# Altium footprint library LDCN Components.PcbLib: 426 footprints (part 12 of 27)
Each footprint in its own frame and in the unit in brackets; x right, y up, seen from the top. Pads: shape width x height; smd on the part's side, far side on the other; paste and mask are expansions set on the pad; w line width, h text height; cw(c..) or ccw(c..) is an arc to the next point about the centre after c.
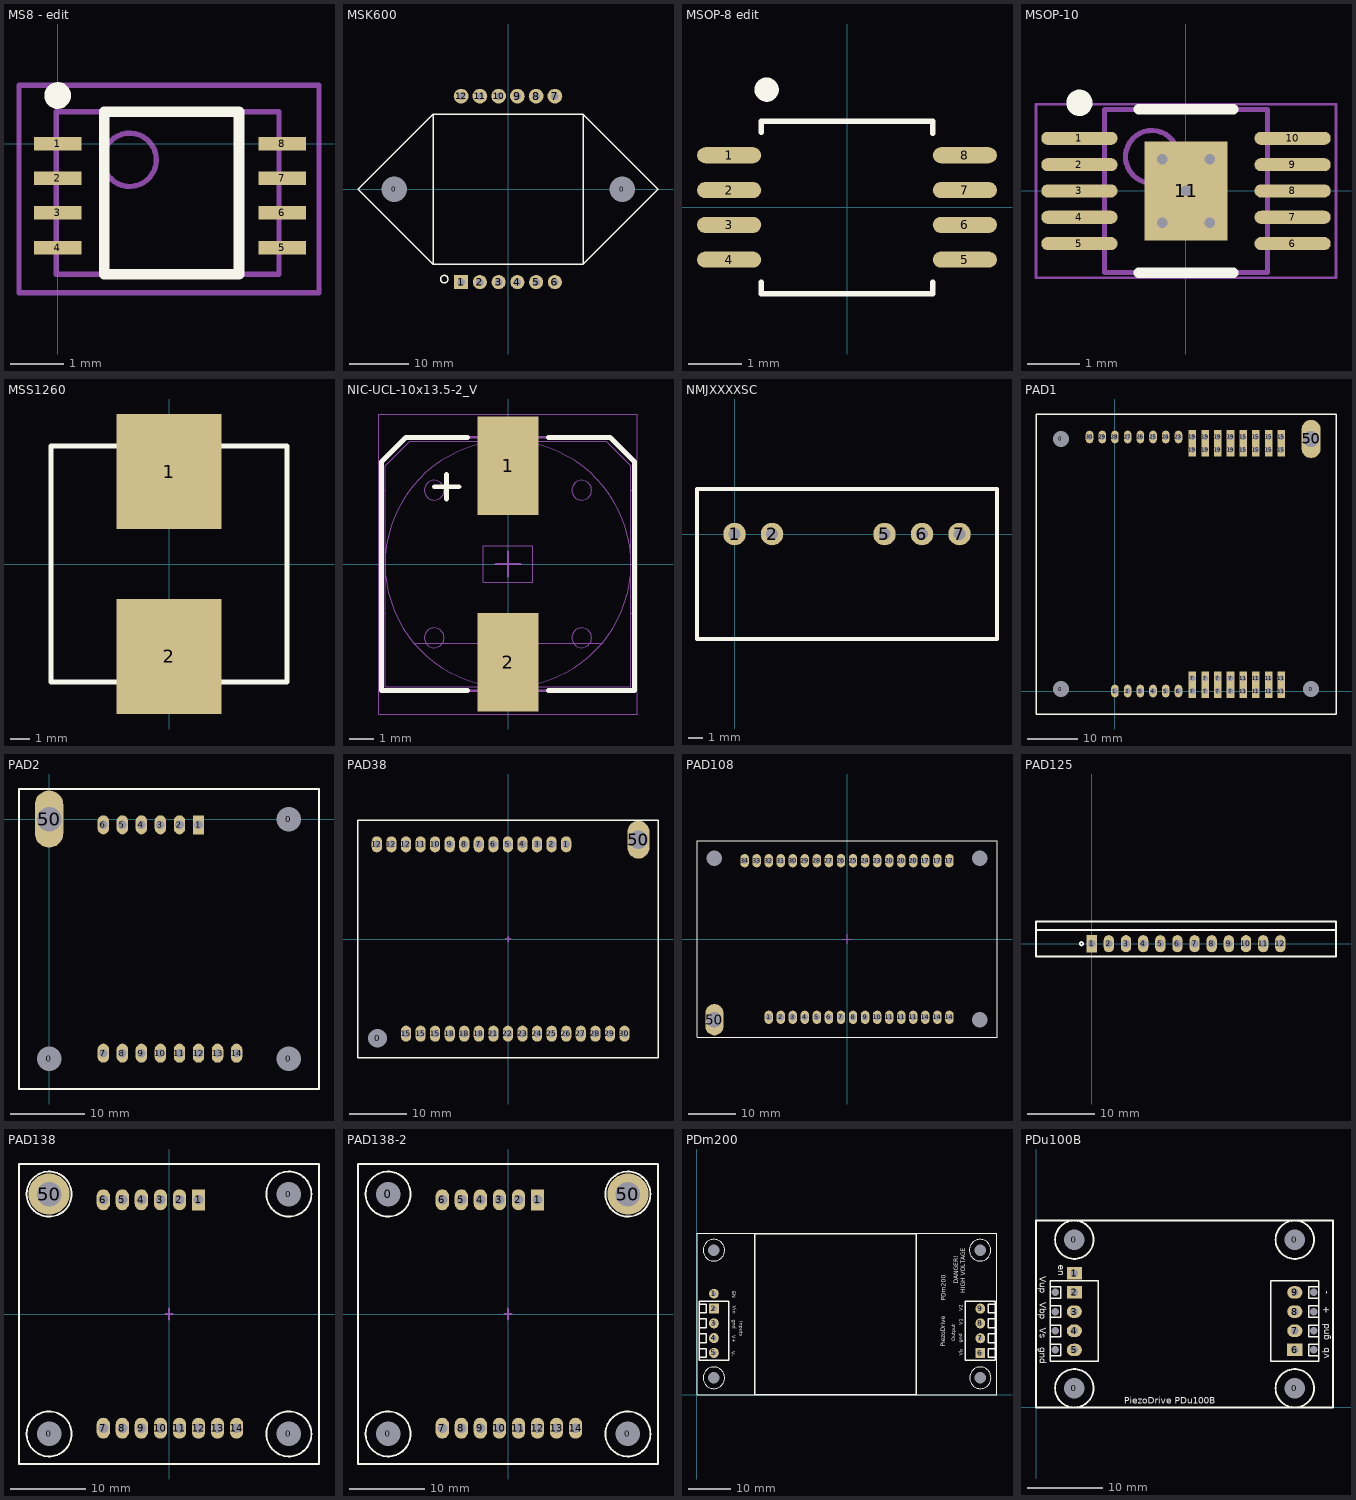
[diagram p11: the footprints below, top view; thin cyan lines are the x and y axes]

## MS8 - edit [mil] "SOIC, 8-Leads, MSOP, Body 3mmx3mm"
height 43.31
pads (8):
  rect 35x10 smd: 1(0,0) 2(0,-25.59) 3(0,-51.18) 4(0,-76.77) 5(165.79,-76.77) 6(165.79,-51.18) 7(165.79,-25.59) 8(165.79,0)
Top Overlay:
  circle w9.84: c0,35.43 r4.92
  lines w7.87: 34.45,-96.46 34.45,23.43 133.86,23.43 133.86,-96.46 34.45,-96.46
Mechanical 13:
  circle w3.94: c53.15,-12.01 r19.68
  lines w3.94: -0.98,-96.46 -0.98,23.43 163.39,23.43 163.39,-96.46 -0.98,-96.46
Mechanical 15:
  lines w3.94: -28.54,-110.24 192.91,-110.24 192.91,43.11 -28.54,43.11 -28.54,-110.24
3D body: height 68.9, standoff 0, extent -0.98,-96.46 163.39,23.43

## MSK600 [mm] "Footprint of MSK600"
height 40
pads (14):
  round 1.524 hole 4.318 unplated: 0(-19.304,0) 0(19.304,0)
  rect 2.4x2.4 hole 1.3: 1(-7.938,-15.748)
  round 2.4 hole 1.3: 2(-4.763,-15.748) 3(-1.587,-15.748) 4(1.587,-15.748) 5(4.763,-15.748) 6(7.938,-15.748)
  round 2.5 hole 1.3: 7(7.938,15.748) 8(4.763,15.748) 9(1.587,15.748) 10(-1.587,15.748) 11(-4.763,15.748) 12(-7.938,15.748)
Top Overlay:
  circle w0.254: c-10.795,-15.24 r0.635
  lines w0.254: -12.7,-12.7 -12.7,12.7 ; -12.7,-12.7 12.7,-12.7 ; -12.7,-12.7 -25.4,0 -12.7,12.7 ; -12.7,12.7 12.7,12.7 ; 12.7,-12.7 12.7,12.7 ; 12.7,-12.7 25.4,0 12.7,12.7

## MSOP-8 edit [mm] "8-Lead Plastic MSOP Package 3mmx3mm"
height 1.1
pads (8):
  oval 1.2x0.3 smd: 1(-2.2,0.975) 2(-2.2,0.325) 3(-2.2,-0.325) 4(-2.2,-0.975) 5(2.2,-0.975) 6(2.2,-0.325) 7(2.2,0.325) 8(2.2,0.975)
Top Overlay:
  circle w0.254: c-1.5,2.2 r0.1
  lines w0.1: -1.6,-1.39 -1.6,-1.61 1.6,-1.61 1.6,-1.39 ; -1.6,1.4 -1.6,1.61 1.6,1.61 1.6,1.38
3D body: height 1.1, standoff 0, extent -1.5,-1.5 1.5,1.5

## MSOP-10 [mm] "MSOP-10 with exposed pad"
height 2
pads (11):
  oval 1.45x0.25 smd: 1(-2.025,1) 2(-2.025,0.5) 3(-2.025,0) 4(-2.025,-0.5) 5(-2.025,-1) 6(2.025,-1) 7(2.025,-0.5) 8(2.025,0) 9(2.025,0.5) 10(2.025,1)
  rect 1.57x1.88 smd: 11(0,0)
via -0.45,0.6 diameter 0.5 hole 0.2
via -0.45,-0.6 diameter 0.5 hole 0.2
via 0.45,-0.6 diameter 0.5 hole 0.2
via 0.45,0.6 diameter 0.5 hole 0.2
via 0,0 diameter 0.5 hole 0.2
Top Overlay:
  circle w0.25: c-2.025,1.675 r0.125
  lines w0.2: -0.9,-1.55 0.9,-1.55 ; -0.9,1.55 0.9,1.55
Mechanical 13:
  circle w0.1: c-0.65,0.65 r0.5
  lines w0.1: -1.55,-1.55 1.55,-1.55 1.55,1.55 -1.55,1.55 -1.55,-1.55
Mechanical 15:
  lines w0.05: -2.85,-1.65 2.85,-1.65 2.85,1.65 -2.85,1.65 -2.85,-1.65
  lines w0.1: -0.5,0 0.5,0 ; 0,-0.5 0,0.5
3D body: height 1.1, standoff 0.05, extent -1.55,-1.55 1.55,1.55

## MSS1260 [mm] "Coilcraft MSS1260 Inductors"
height 6
pads (2):
  rect 5.5x6 smd: 1(0,4.826) 2(0,-4.826)
Top Overlay:
  lines w0.254: -6.15,-6.15 6.15,-6.15 6.15,6.15 -6.15,6.15 -6.15,-6.15

## NIC-UCL-10x13.5-2_V [mm] "SMD, 2-Leads,Body 10.3x10.3mm, Height 14.3mm"
height 14.3
pads (2):
  rect 2.5x4 smd: 1(0,4) 2(0,-4)
Top Overlay:
  lines w0.2: -3,3.143 -2,3.143 ; -2.5,2.643 -2.5,3.643 ; -1.65,-5.15 -5.15,-5.15 -5.15,4.15 -4.15,5.15 -1.65,5.15 ; 1.65,-5.15 5.15,-5.15 5.15,4.15 4.15,5.15 1.65,5.15
Mechanical 13:
  circle w0.01: c-3,3 r0.4
  circle w0.01: c3,3 r0.4
  circle w0.01: c-3,-3 r0.4
  circle w0.01: c3,-3 r0.4
  lines w0.01: -0.5,-5.45 0.5,-5.45 0.5,-2.65 ; -0.5,-5.45 -0.5,-2.651 ; 0.499,2.651 0.499,5.449 ; 0.5,5.45 -0.5,5.45 -0.5,2.65 ; -5.149,-5.149 5.149,-5.149 ; -5.15,-5.15 -5.15,-2 -5,-2 -5,-5 ; -5.15,-5.15 5.15,-5.15 ; -5,-5 5,-5 ; -5,-5 -5,4 ; -5,-5 5,-5 ; -5,4 -4,5 ; -5,4 -5,3 -5.15,3 -5.15,4.15 -4.15,5.15 4.15,5.15 5.15,4.15 5.15,3 5,3 5,4 ; -5,4 -4,5 ; -4,5 4,5 ; -4,5 4,5 ; -3.83,-3.214 ccw(c0,0) 3.83,-3.214 ; -3.83,-3.214 cw(c0,0) 3.83,-3.214 ; -3.83,-3.214 3.83,-3.214 ; -3.83,-3.214 3.83,-3.214 ; -3.83,-3.214 3.83,-3.214 ; -0.5,2.65 ccw(c0,2.65) 0.5,2.65 -0.5,2.65 ; 0.5,-2.65 ccw(c0,-2.65) -0.5,-2.65 0.5,-2.65 ; 4,5 5,4 ; 4,5 5,4 ; 5,-5 5,4 ; 5,-5 5,-2 5.15,-2 5.15,-5.149 5.149,-5.149 ; -1,-0.75 1,-0.75 1,0.75 -1,0.75 -1,-0.75
  lines w0.1: -5.15,-5.15 -5.15,4.15 -4.15,5.15 4.15,5.15 5.15,4.15 5.15,-5.15 -5.15,-5.15
Mechanical 15:
  lines w0.05: -5.25,-6.1 5.25,-6.1 5.25,6.1 -5.25,6.1 -5.25,-6.1
  lines w0.1: -0.5,0 0.5,0 ; 0,-0.5 0,0.5
3D body: height 0.5, standoff 0.3, extent -5,-5 5,5
3D body: height 0.8, standoff 0.3, extent -5.15,-5.001 5.15,5.15
3D body: height 0.8, standoff 0.3, extent -5.149,-5.149 5.149,3.999
3D body: height 14.3, standoff 0.5, extent -5.004,-3.214 5.001,5.012
3D body: height 14.3, standoff 0.5, extent -3.831,-5.001 3.831,-3.213
3D body: height 0.3, standoff 0, extent -0.499,2.651 0.499,5.449
3D body: height 0.3, standoff 0, extent -0.499,2.152 0.499,2.651
3D body: height 0.3, standoff 0, extent -1,-0.75 1,0.75
3D body: height 0.3, standoff 0, extent -0.5,-2.651 0.499,-2.152
3D body: height 0.3, standoff 0, extent -0.5,-5.45 0.499,-2.651
3D body: height 1.2, standoff 0.8, extent -5.151,2.999 5.151,5.151
3D body: height 0.3, standoff 0, extent 2.601,2.601 3.399,3.399
3D body: height 0.3, standoff 0, extent -3.399,2.601 -2.601,3.399
3D body: height 0.3, standoff 0, extent 2.601,-3.399 3.399,-2.601
3D body: height 0.3, standoff 0, extent -3.399,-3.399 -2.601,-2.601
3D body: height 1.5, standoff 0.8, extent -5.149,-5.149 5.149,-2.001

## NMJXXXXSC [mil]
height 393.7
pads (5):
  round 60 hole 32: 1(0,0) 2(100,0) 5(400,0) 6(500,0) 7(600,0)
Top Overlay:
  lines w10: -100,-280 700,-280 700,120 -100,120 -100,-280

## PAD1 [mil] "Footprint of PAD115"
height 196.85
pads (50):
  round 60 hole 129 unplated: 0(-425,15.5) 0(-425,1984.5) 0(1544,15.5)
  oval 60x100 hole 45: 1(0,0) 2(100,0) 3(200,0) 4(300,0) 5(400,0) 6(500,0) 23(500,2000) 24(400,2000) 25(300,2000) 26(200,2000) 27(100,2000) 28(0,2000) 29(-100,2000) 30(-200,2000)
  rect 60x110 hole 45: 7(610,0) 7(610,100) 7(710,0) 7(710,100) 7(810,0) 7(810,100) 7(910,0) 7(910,100) 11(1010,0) 11(1010,100) 11(1110,0) 11(1110,100) 11(1210,0) 11(1210,100) 11(1310,0) 11(1310,100) 15(1010,1900) 15(1010,2000) 15(1110,1900) 15(1110,2000) 15(1210,1900) 15(1210,2000) 15(1310,1900) 15(1310,2000) 19(610,1900) 19(610,2000) 19(710,1900) 19(710,2000) 19(810,1900) 19(810,2000) 19(910,1900) 19(910,2000)
  oval 150x300 hole 129: 50(1544,1984.5)
Top Overlay:
  lines w10: -621.5,-181 1740.5,-181 1740.5,2181 -621.5,2181 -621.5,-181

## PAD2 [mil] "Footprint of PAD183"
height 1574.8
pads (18):
  round 60 hole 129 unplated: 0(-0.16,-1260) 0(1259.84,-1260) 0(1259.84,0)
  rect 60x100 hole 45: 1(784.84,-30)
  oval 60x100 hole 45: 2(684.84,-30) 3(584.84,-30) 4(484.84,-30) 5(384.84,-30) 6(284.84,-30) 7(284.84,-1230) 8(384.84,-1230) 9(484.84,-1230) 10(584.84,-1230) 11(684.84,-1230) 12(784.84,-1230) 13(884.84,-1230) 14(984.84,-1230)
  oval 150x300 hole 129: 50(-0.16,0)
Top Overlay:
  lines w10: -158.16,-1418 1417.84,-1418 1417.84,158 -158.16,158 -158.16,-1418

## PAD38 [mil] "PAD38"
height 196.85
pads (32):
  round 78.74 hole 129: 0(-895.47,-681.5)
  oval 70x110 hole 52: 1(399.41,650) 2(299.41,650) 3(199.41,650) 4(99.41,650) 5(-0.59,650) 6(-100.59,650) 7(-200.59,650) 8(-300.59,650) 9(-400.59,650) 10(-500.59,650) 11(-600.59,650) 12(-900.59,650) 12(-800.59,650) 12(-700.59,650) 15(-700.2,-650) 15(-600.2,-650) 15(-500.2,-650) 18(-400.2,-650) 18(-300.2,-650) 18(-200.2,-650) 21(-100.2,-650) 22(-0.2,-650) 23(99.8,-650) 24(199.8,-650) 25(299.8,-650) 26(399.8,-650) 27(499.8,-650) 28(599.8,-650) 29(699.8,-650) 30(799.8,-650)
  oval 150x260 hole 129: 50(895.47,681.5)
Top Overlay:
  lines w10: -1029.92,-816.54 -1029.92,816.54 1029.92,816.54 1029.92,-816.54 -1029.92,-816.54
Mechanical 15:
  lines w10: -19.68,0 19.68,0 ; -0.2,-19.29 0,-19.09 0,19.68

## PAD108 [mil] "PAD108"
height 196.85
pads (38):
  round 60 hole 129 unplated: 0(-1100,670) 0(1100,-670) 0(1100,670)
  oval 70x110 hole 52: 1(-650,-650) 2(-550,-650) 3(-450,-650) 4(-350,-650) 5(-250,-650) 6(-150,-650) 7(-50,-650) 8(50,-650) 9(150,-650) 10(250,-650) 11(350,-650) 11(450,-650) 11(550,-650) 14(650,-650) 14(750,-650) 14(850,-650) 17(650,650) 17(750,650) 17(850,650) 20(350,650) 20(450,650) 20(550,650) 23(250,650) 24(150,650) 25(50,650) 26(-50,650) 27(-150,650) 28(-250,650) 29(-350,650) 30(-450,650) 31(-550,650) 32(-650,650) 33(-750,650) 34(-850,650)
  oval 150x260 hole 129: 50(-1100,-670)
Top Overlay:
  lines w10: -1245,-815 -1245,815 1245,815 1245,-815 -1245,-815
Mechanical 15:
  lines w10: -39.37,0 39.37,0 ; 0,-39.37 0,39.37

## PAD125 [mil] "Footprint of PAD125"
height 196.85
pads (12):
  rect 60x100 hole 45: 1(0,0)
  oval 60x100 hole 45: 2(100,0) 3(200,0) 4(300,0) 5(400,0) 6(500,0) 7(600,0) 8(700,0) 9(800,0) 10(900,0) 11(1000,0) 12(1100,0)
Top Overlay:
  circle w10: c-60,0 r10
  lines w10: -325,80 1425,80 ; -325,-75 1425,-75 1425,130 -325,130 -325,-75

## PAD138 [mil] "PAD138"
height 1574.8
pads (18):
  round 60 hole 129 unplated: 0(-630,-630) 0(630,-630) 0(630,630)
  rect 70x110 hole 52.01: 1(155,600)
  oval 70x110 hole 52.01: 2(55,600) 3(-45,600) 4(-145,600) 5(-245,600) 6(-345,600) 7(-345,-600) 8(-245,-600) 9(-145,-600) 10(-45,-600) 11(55,-600) 12(155,-600) 13(255,-600) 14(355,-600)
  round 216.54 hole 129: 50(-630,630)
Top Overlay:
  circle w10: c-630,630 r118.11
  circle w10: c-630,-630 r118.11
  circle w10: c630,-630 r118.11
  circle w10: c630,630 r118.11
  lines w10: -788,-788 -788,788 788,788 788,-788 -788,-788
Mechanical 15:
  lines w10: -19.61,0.08 -19.53,0 19.76,0 ; 0,-29.53 0,29.53

## PAD138-2 [mil] "PAD138-2"
height 1574.8
pads (18):
  round 60 hole 129 unplated: 0(-630,-630) 0(630,-630)
  round 78.74 hole 129: 0(-630,630)
  rect 70x110 hole 52.01: 1(155,600)
  oval 70x110 hole 52.01: 2(55,600) 3(-45,600) 4(-145,600) 5(-245,600) 6(-345,600) 7(-345,-600) 8(-245,-600) 9(-145,-600) 10(-45,-600) 11(55,-600) 12(155,-600) 13(255,-600) 14(355,-600)
  round 216.54 hole 129 unplated: 50(630,630)
Top Overlay:
  circle w10: c630,630 r118.11
  circle w10: c-630,-630 r118.11
  circle w10: c630,-630 r118.11
  circle w10: c-630,630 r118.11
  lines w10: -788,-788 788,-788 788,788 -788,788 -788,-788
Mechanical 15:
  lines w10: -19.61,0.08 -19.53,0 19.76,0 ; 0,-29.53 0,29.53

## PDm200 [mm] "PiezoDrive PDm200 Module"
height 30
pads (13):
  round 1.524 hole 2.7 unplated: 0(4.043,34.2) 0(4.043,4) 0(66.993,34.2) 0(67.043,4.001)
  round 2.3 hole 1.15: 1(4.043,23.9)
  rect 2.3x2.3 hole 1.15: 2(4.043,20.4) 6(67.043,9.874)
  oval 2.3x2.4 hole 1.15: 3(4.043,16.9) 4(4.043,13.4) 5(4.043,9.9) 7(67.043,13.374) 8(67.043,16.874) 9(67.043,20.374)
Top Overlay:
  circle w0.254: c4.043,4 r2.54
  circle w0.254: c67.043,4.001 r2.54
  circle w0.254: c4.043,34.2 r2.54
  circle w0.254: c66.993,34.2 r2.54
  lines w0.254: 0.043,0 70.993,0 70.993,38.2 0.043,38.2 0.043,0
  lines w0.3: 13.744,0 13.744,38.1 51.844,38.1 51.844,0 13.744,0
  lines w0.305: 0.543,8.85 2.218,8.85 2.218,10.925 0.543,10.925 ; 0.543,12.35 2.218,12.35 2.218,14.425 0.543,14.425 ; 0.543,15.85 2.218,15.85 2.218,17.925 0.543,17.925 ; 0.543,19.375 2.218,19.375 2.218,21.45 0.543,21.45 ; 70.543,8.824 68.868,8.824 68.868,10.899 70.543,10.899 ; 70.543,12.349 68.868,12.349 68.868,14.424 70.543,14.424 ; 70.543,15.849 68.868,15.849 68.868,17.924 70.543,17.924 ; 70.543,19.349 68.868,19.349 68.868,21.424 70.543,21.424 ; 0.543,8.2 0.543,22.15 7.543,22.15 7.543,8.2 0.543,8.2 ; 63.543,8.124 63.543,22.074 70.543,22.074 70.543,8.124 63.543,8.124
  text "V+" at 8.323,14.023 h0.89
  text "V-" at 8.316,10.339 h0.89
  text "Vin" at 8.443,20.999 h0.89
  text "EN" at 8.425,24.511 h0.89
  text "Vb" at 62.843,9.175 h0.89
  text "gnd" at 62.743,12.283 h0.89
  text "V1" at 62.918,16.444 h0.89
  text "V2" at 62.843,19.725 h0.89
  text "Output" at 61.13,12.7 h0.89
  text "PiezoDrive" at 58.717,11.303 h1.02
  text "PDm200" at 58.844,22.225 h1.02
  text "DANGER!" at 61.887,26.295 h1
  text "gnd" at 8.443,17.749 h0.89
  text "Inputs" at 10.203,17.399 h0.89
  text "HIGH VOLTAGE" at 63.487,23.995 h1

## PDu100B [mm] "PiezoDrive PDu100B Module"
height 15
pads (21):
  rect 0x0 hole 1 unplated: 0(2.54,7.62) 0(2.54,10.16) 0(2.54,12.7) 0(2.54,15.24) 0(36.83,7.62) 0(36.83,10.16) 0(36.83,12.7) 0(36.83,15.24)
  round 1.524 hole 2.7 unplated: 0(5.08,2.54) 0(5.08,22.225) 0(34.29,2.54) 0(34.29,22.225)
  rect 2x1.651 hole 1: 1(5.08,17.78) 2(5.08,15.24) 6(34.29,7.62)
  oval 2x1.651 hole 1: 3(5.08,12.7) 4(5.08,10.16) 5(5.08,7.62) 7(34.29,10.16) 8(34.29,12.7) 9(34.29,15.24)
Bottom Layer:
  lines w0.203: 5.08,12.7 5.588,12.7
Top Overlay:
  circle w0.254: c34.29,22.225 r2.54
  circle w0.254: c34.29,2.54 r2.54
  circle w0.254: c5.08,2.54 r2.54
  circle w0.254: c5.08,22.225 r2.54
  lines w0.203: 1.905,6.858 3.255,6.858 3.255,8.382 1.905,8.382 ; 1.905,9.398 3.255,9.398 3.255,10.922 1.905,10.922 ; 1.905,11.938 3.255,11.938 3.255,13.462 1.905,13.462 ; 1.905,14.478 3.255,14.478 3.255,16.002 1.905,16.002 ; 37.465,6.858 36.115,6.858 36.115,8.382 37.465,8.382 ; 37.465,9.398 36.115,9.398 36.115,10.922 37.465,10.922 ; 37.465,11.938 36.115,11.938 36.115,13.462 37.465,13.462 ; 37.465,14.478 36.115,14.478 36.115,16.002 37.465,16.002 ; 1.905,6.096 1.905,16.764 8.255,16.764 8.255,6.096 1.905,6.096 ; 31.115,6.096 37.465,6.096 37.465,16.764 31.115,16.764 31.115,6.096
  lines w0.254: 0,0 39.37,0 39.37,24.765 0,24.765 0,0
  text "PiezoDrive PDu100B" at 11.684,0.508 h0.89
  text "Vbp" at 0.508,13.97 h0.89
  text "Vup" at 0.508,17.399 h0.89
  text "Vs" at 0.508,10.541 h0.89
  text "en" at 2.921,18.923 h0.89
  text "gnd" at 0.508,8.001 h0.89
  text "-" at 38.862,14.986 h0.89
  text "vb" at 38.862,6.477 h0.89
  text "+" at 38.862,12.446 h0.89
  text "gnd" at 38.862,8.89 h0.89